# Altium footprint library csy.PcbLib: 198 footprints (part 3 of 13)
Each footprint in its own frame and in the unit in brackets; x right, y up, seen from the top. Pads: shape width x height; smd on the part's side, far side on the other; paste and mask are expansions set on the pad; w line width, h text height; cw(c..) or ccw(c..) is an arc to the next point about the centre after c.
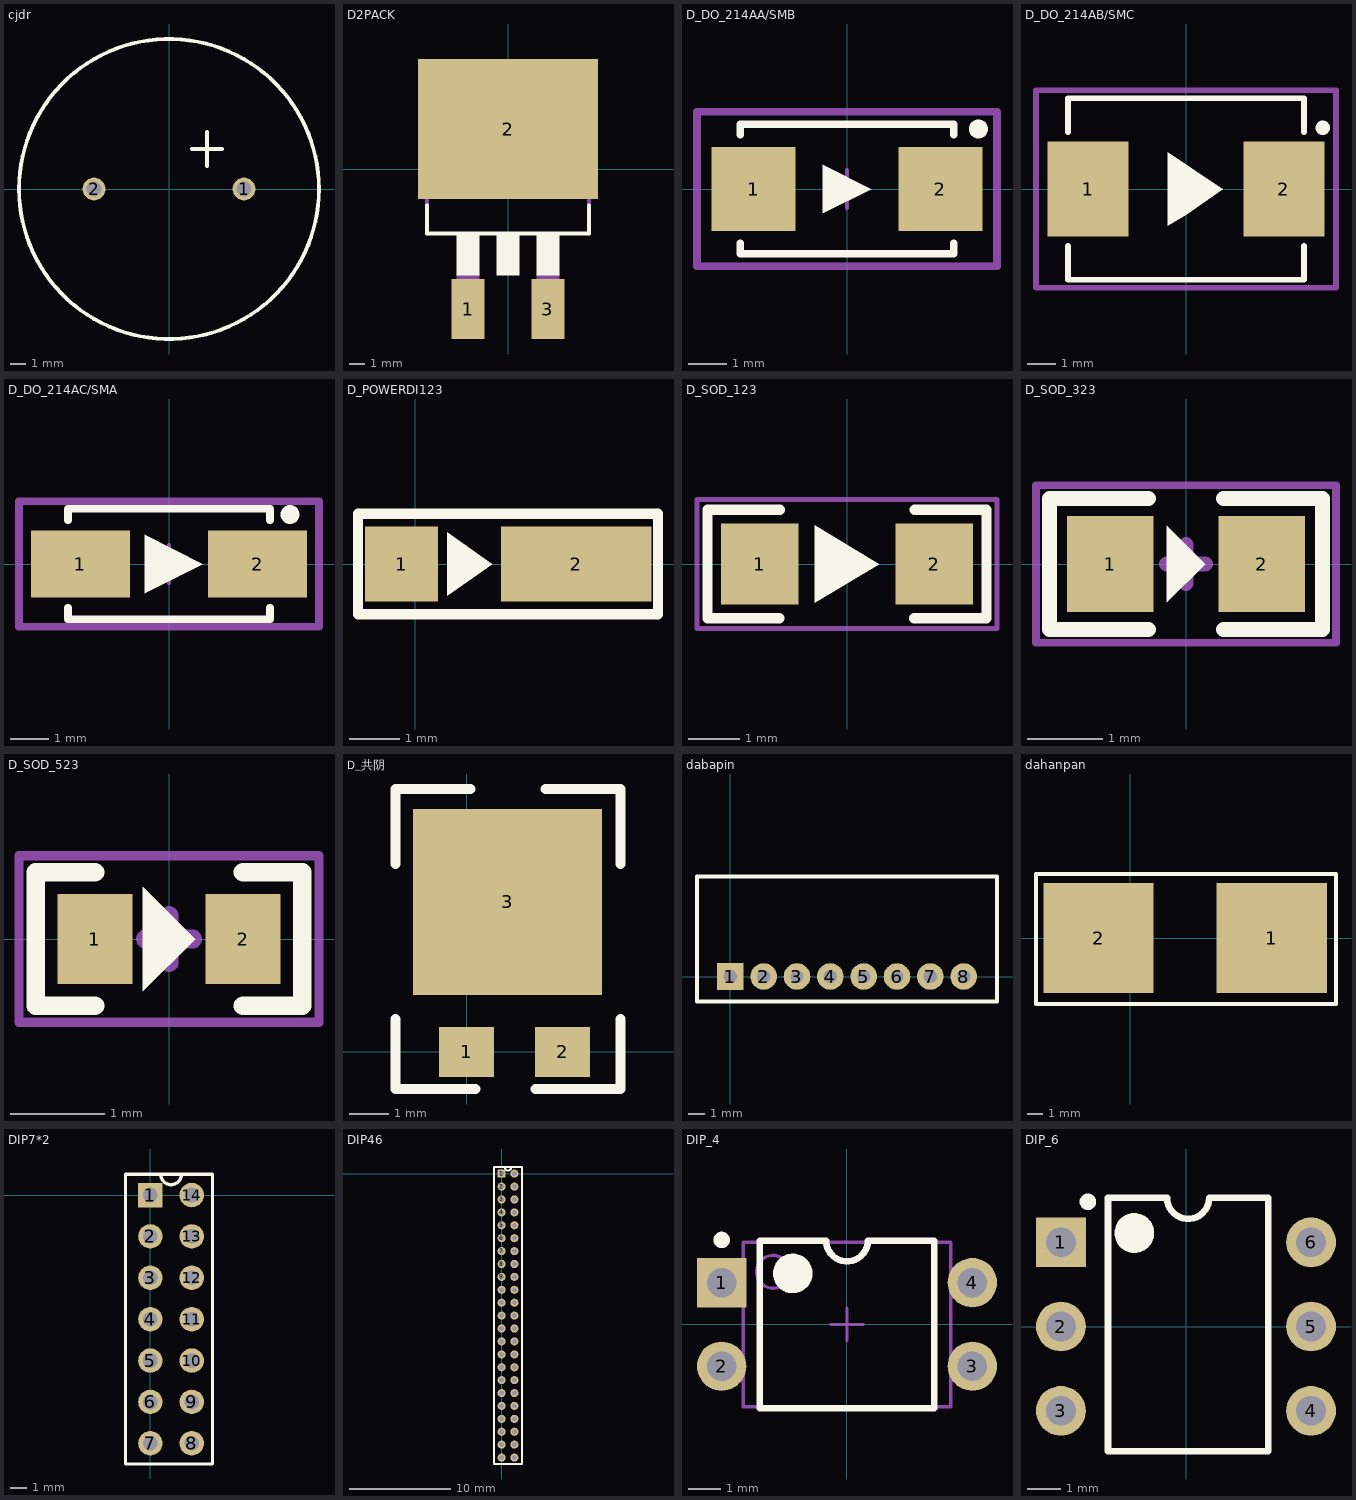
[diagram p2: the footprints below, top view; thin cyan lines are the x and y axes]

## cjdr [mm]
pads (2):
  round 1.524 hole 1: 1(5,0) 2(-5,0)
Top Overlay:
  circle w0.254: c0,0 r10
  lines w0.254: 1.524,2.667 3.556,2.667 ; 2.54,1.524 2.54,3.81

## D2PACK [mil]
pads (3):
  rect 82x150 smd: 1(-100,-350) 3(100,-350)
  rect 450x350 smd: 2(0,100)
Top Overlay:
  region: -128.04,-167 -72,-167 -72,-265.08 -128.04,-265.08
  region: 72.04,-167 128,-167 128,-265.15 72.04,-265.15
  region: -28.04,-167 28,-167 28,-265.38 -28.04,-265.38
  lines w10: -202,-91 -202,-161 202,-161 202,-91
Mechanical 1:
  region: -122.24,-319 -78,-319 -78,-375.74 -122.24,-375.74
  region: -128.1,-265 -72,-265 -72,-321.24 -128.1,-321.24
  region: 78.08,-319 122,-319 122,-375.4 78.08,-375.4
  region: 72.04,-265 128,-265 128,-321.19 72.04,-321.19
  lines w10: -202,-161 -202,175 ; 202,-161 202,175 ; -202,175 -202,185 -133,229 123,229 202,175 ; -202,175 202,175

## D_DO_214AA/SMB [mm] "2816   7mmX4mm二极管"
height 2.438
pads (2):
  rect 2.2x2.2 smd: 1(-2.45,0) 2(2.45,0)
Top Overlay:
  circle w0.25: c3.45,1.575 r0.125
  region: 0.635,0 -0.635,0.635 -0.635,-0.635
  lines w0.2: -2.8,-1.425 -2.8,-1.7 2.8,-1.7 2.8,-1.425 ; -2.8,1.425 -2.8,1.7 2.8,1.7 2.8,1.425
Mechanical 15:
  lines w0.1: -0.5,0 0.5,0 ; 0,-0.5 0,0.5
  lines w0.2: -3.937,-2.032 3.937,-2.032 3.937,2.032 -3.937,2.032 -3.937,-2.032
3D body "DO_214AA.STEP": height 2.12, standoff 0, extent -2.832,-1.778 2.832,1.778

## D_DO_214AB/SMC [mm] "3826   9.5mmX6.5mm二极管"
height 2.616
pads (2):
  rect 2.8x3.3 smd: 1(-3.4,0) 2(3.4,0)
Top Overlay:
  circle w0.25: c4.75,2.125 r0.125
  region: 1.27,0 0,-0.889 -0.635,-1.27 -0.635,1.27
  lines w0.2: -4.1,-1.975 -4.1,-3.15 4.1,-3.15 4.1,-1.975 ; -4.1,1.975 -4.1,3.15 4.1,3.15 4.1,1.975
Mechanical 15:
  lines w0.1: -0.5,0 0.5,0 ; 0,-0.5 0,0.5
  lines w0.2: -5.207,-3.429 -5.207,3.429 5.207,3.429 5.207,-3.429 -5.207,-3.429
3D body "DO_214AB.STEP": height 2.87, standoff -0.01, extent -3.975,-2.95 3.975,2.95

## D_DO_214AC/SMA [mm] "2812   7mmX3mm二极管"
height 2.438
pads (2):
  rect 2.6x1.75 smd: 1(-2.328,0) 2(2.328,0)
Top Overlay:
  circle w0.25: c3.175,1.3 r0.125
  region: -0.635,-0.762 -0.635,0 0.889,0
  region: 0.889,0 -0.635,0 -0.635,0.762
  lines w0.2: -2.65,-1.15 -2.65,-1.45 2.65,-1.45 2.65,-1.15 ; -2.65,1.15 -2.65,1.45 2.65,1.45 2.65,1.15
Mechanical 15:
  lines w0.1: -0.5,0 0.5,0 ; 0,-0.5 0,0.5
  lines w0.2: -3.937,-1.651 3.937,-1.651 3.937,1.651 -3.937,1.651 -3.937,-1.651
3D body "DO_214AC.STEP": height 2.41, standoff 0, extent -2.642,-1.448 2.641,1.448

## D_POWERDI123 [mm]
pads (2):
  rect 1.45x1.5 smd: 1(-0.275,0)
  rect 3x1.5 smd: 2(3.2,0)
Top Overlay:
  region: 0.635,0.635 1.27,0 1.524,0
  region: 1.524,0 1.27,0 0.635,0.635 0.635,-0.635
  lines w0.203: -1.143,-1 4.826,-1 4.826,1 -1.143,1 -1.143,-1
3D body "TVS.STEP": height 1.4, standoff 0.15, extent -0.131,-0.965 3.769,0.965

## D_SOD_123 [mm] "1206大小，二极管"
pads (2):
  rect 1.52x1.6 smd: 1(-1.713,0) 2(1.712,0)
Top Overlay:
  region: -0.635,0.762 -0.635,-0.762 0.635,0
  lines w0.2: -1.331,-1.067 -2.743,-1.067 -2.743,1.067 -1.323,1.067 ; 1.322,-1.067 2.743,-1.067 2.743,1.067 1.331,1.067
Mechanical 15:
  lines w0.1: -2.946,-1.27 -2.946,1.27 2.946,1.27 2.946,-1.27 -2.946,-1.27
  lines w0.2: -0.254,0 0.254,0 ; 0,-0.254 0,0.254
3D body "零件2.STEP": height 1.5, standoff 0, extent -1.873,-0.75 2.127,0.75

## D_SOD_323 [mil] "0805[2012]大小，二极管"
pads (2):
  rect 45x50 smd: 1(-39.5,0) 2(39.5,0)
Top Overlay:
  region: -10,20 -10,-20 10,0
  lines w7.87: -19.5,-34 -71,-34 -71,34 -19.5,34 ; 19.5,-34 71,-34 71,34 19.5,34
Mechanical 15:
  lines w3.94: -78,-41 -78,41 78,41 78,-41 -78,-41
  lines w7.87: -10,0 10,0 ; 0,-10 0,10
3D body "LED_0805(B).STEP": height 39.37, standoff -0.39, extent -39.99,-24.99 40.01,25

## D_SOD_523 [mm] "0603大小，二极管"
pads (2):
  rect 0.8x0.96 smd: 1(-0.79,0) 2(0.79,0)
Top Overlay:
  region: -0.279,0.559 -0.279,-0.559 0.279,0
  lines w0.2: -0.79,-0.711 -1.422,-0.711 -1.422,0.711 -0.79,0.711 ; 0.79,-0.711 1.422,-0.711 1.422,0.711 0.79,0.711
Mechanical 15:
  lines w0.1: -1.6,-0.889 1.6,-0.889 1.6,0.889 -1.6,0.889 -1.6,-0.889
  lines w0.2: -0.254,0 0.254,0 ; 0,-0.254 0,0.254

## D_共阴 [mm]
pads (3):
  rect 1.4x1.27 smd: 1(0,0) 2(2.44,0)
  rect 4.8x4.72 smd: 3(1.04,3.805)
Top Overlay:
  lines w0.254: -1.805,0.833 -1.805,-0.945 0.227,-0.945 ; -1.805,4.77 -1.805,6.675 0.1,6.675 ; 1.751,-0.945 3.91,-0.945 3.91,0.833 ; 2.005,6.675 3.91,6.675 3.91,4.77

## dabapin [mm]
pads (8):
  rect 1.6x1.6 hole 0.8: 1(0,0)
  round 1.6 hole 0.8: 2(2,0) 3(4,0) 4(6,0) 5(8,0) 6(10,0) 7(12,0) 8(14,0)
Top Overlay:
  lines w0.254: -2,-1.5 -2,6 16,6 16,-1.5 -2,-1.5

## dahanpan [mm]
pads (2):
  rect 7x7 smd: 1(9,0) 2(-2,0)
Top Overlay:
  lines w0.254: -5.969,-4.191 13.081,-4.191 13.081,4.064 -5.969,4.064 -5.969,3.683 -5.969,-4.191

## DIP7*2 [mm]
pads (14):
  rect 1.5x1.5 hole 0.9: 1(0,0)
  round 1.5 hole 0.9: 2(0,-2.54) 3(0,-5.08) 4(0,-7.62) 5(0,-10.16) 6(0,-12.7) 7(0,-15.24) 8(2.54,-15.24) 9(2.54,-12.7) 10(2.54,-10.16) 11(2.54,-7.62) 12(2.54,-5.08) 13(2.54,-2.54) 14(2.54,0)
Top Overlay:
  lines w0.2: -1.524,-16.51 -1.524,1.27 1.905,1.27 cw(c1.27,1.27) 0.635,1.27 3.81,1.27 3.81,-16.51 -1.524,-16.51

## DIP46 [mm]
pads (46):
  rect 0.8x0.8 hole 0.5: 1(0,0)
  round 0.8 hole 0.5: 2(0,-1.27) 3(0,-2.54) 4(0,-3.81) 5(0,-5.08) 6(0,-6.35) 7(0,-7.62) 8(0,-8.89) 9(0,-10.16) 10(0,-11.43) 11(0,-12.7) 12(0,-13.97) 13(0,-15.24) 14(0,-16.51) 15(0,-17.78) 16(0,-19.05) 17(0,-20.32) 18(0,-21.59) 19(0,-22.86) 20(0,-24.13) 21(0,-25.4) 22(0,-26.67) 23(0,-27.94) 24(1.27,-27.94) 25(1.27,-26.67) 26(1.27,-25.4) 27(1.27,-24.13) 28(1.27,-22.86) 29(1.27,-21.59) 30(1.27,-20.32) 31(1.27,-19.05) 32(1.27,-17.78) 33(1.27,-16.51) 34(1.27,-15.24) 35(1.27,-13.97) 36(1.27,-12.7) 37(1.27,-11.43) 38(1.27,-10.16) 39(1.27,-8.89) 40(1.27,-7.62) 41(1.27,-6.35) 42(1.27,-5.08) 43(1.27,-3.81) 44(1.27,-2.54) 45(1.27,-1.27) 46(1.27,0)
Top Overlay:
  lines w0.2: -0.762,-28.575 2.032,-28.575 2.032,0.635 0.318,0.635 ccw(c0.635,0.635) 0.953,0.635 -0.762,0.635 -0.762,-28.575

## DIP_4 [mm]
pads (4):
  rect 1.5x1.5 hole 0.9: 1(-3.81,1.27)
  round 1.5 hole 0.9: 2(-3.81,-1.27) 3(3.81,-1.27) 4(3.81,1.27)
Top Overlay:
  circle w0.6: c-1.65,1.55 r0.3
  circle w0.25: c-3.81,2.57 r0.125
  lines w0.2: -2.65,-2.55 2.65,-2.55 2.65,2.55 0.635,2.55 cw(c0,2.55) -0.635,2.55 -2.65,2.55 -2.65,-2.55
Mechanical 13:
  circle w0.1: c-2.25,1.6 r0.5
  lines w0.1: -3.15,-2.5 3.15,-2.5 3.15,2.5 -3.15,2.5 -3.15,-2.5
Mechanical 15:
  lines w0.1: -0.5,0 0.5,0 ; 0,-0.5 0,0.5
3D body: height 5.6, standoff 0, extent -3.15,-2.5 3.15,2.5

## DIP_6 [mm]
pads (6):
  rect 1.5x1.5 hole 0.9: 1(-3.772,2.54)
  round 1.5 hole 0.9: 2(-3.772,0) 3(-3.772,-2.54) 4(3.772,-2.54) 5(3.772,0) 6(3.772,2.54)
Top Overlay:
  circle w0.25: c-2.957,3.759 r0.125
  circle w0.6: c-1.557,2.819 r0.3
  lines w0.2: -2.349,-3.759 -2.349,3.88 -0.572,3.88 ccw(c0.064,3.88) 0.699,3.88 2.476,3.88 2.476,-3.759 -2.349,-3.759
3D body "DIP-6.STEP": height 4.31, standoff -3.28, extent -4.038,-3.991 3.962,4.089